# Altium footprint library u025Library.PcbLib: 144 footprints (part 2 of 9)
Each footprint in its own frame and in the unit in brackets; x right, y up, seen from the top. Pads: shape width x height; smd on the part's side, far side on the other; paste and mask are expansions set on the pad; w line width, h text height; cw(c..) or ccw(c..) is an arc to the next point about the centre after c.
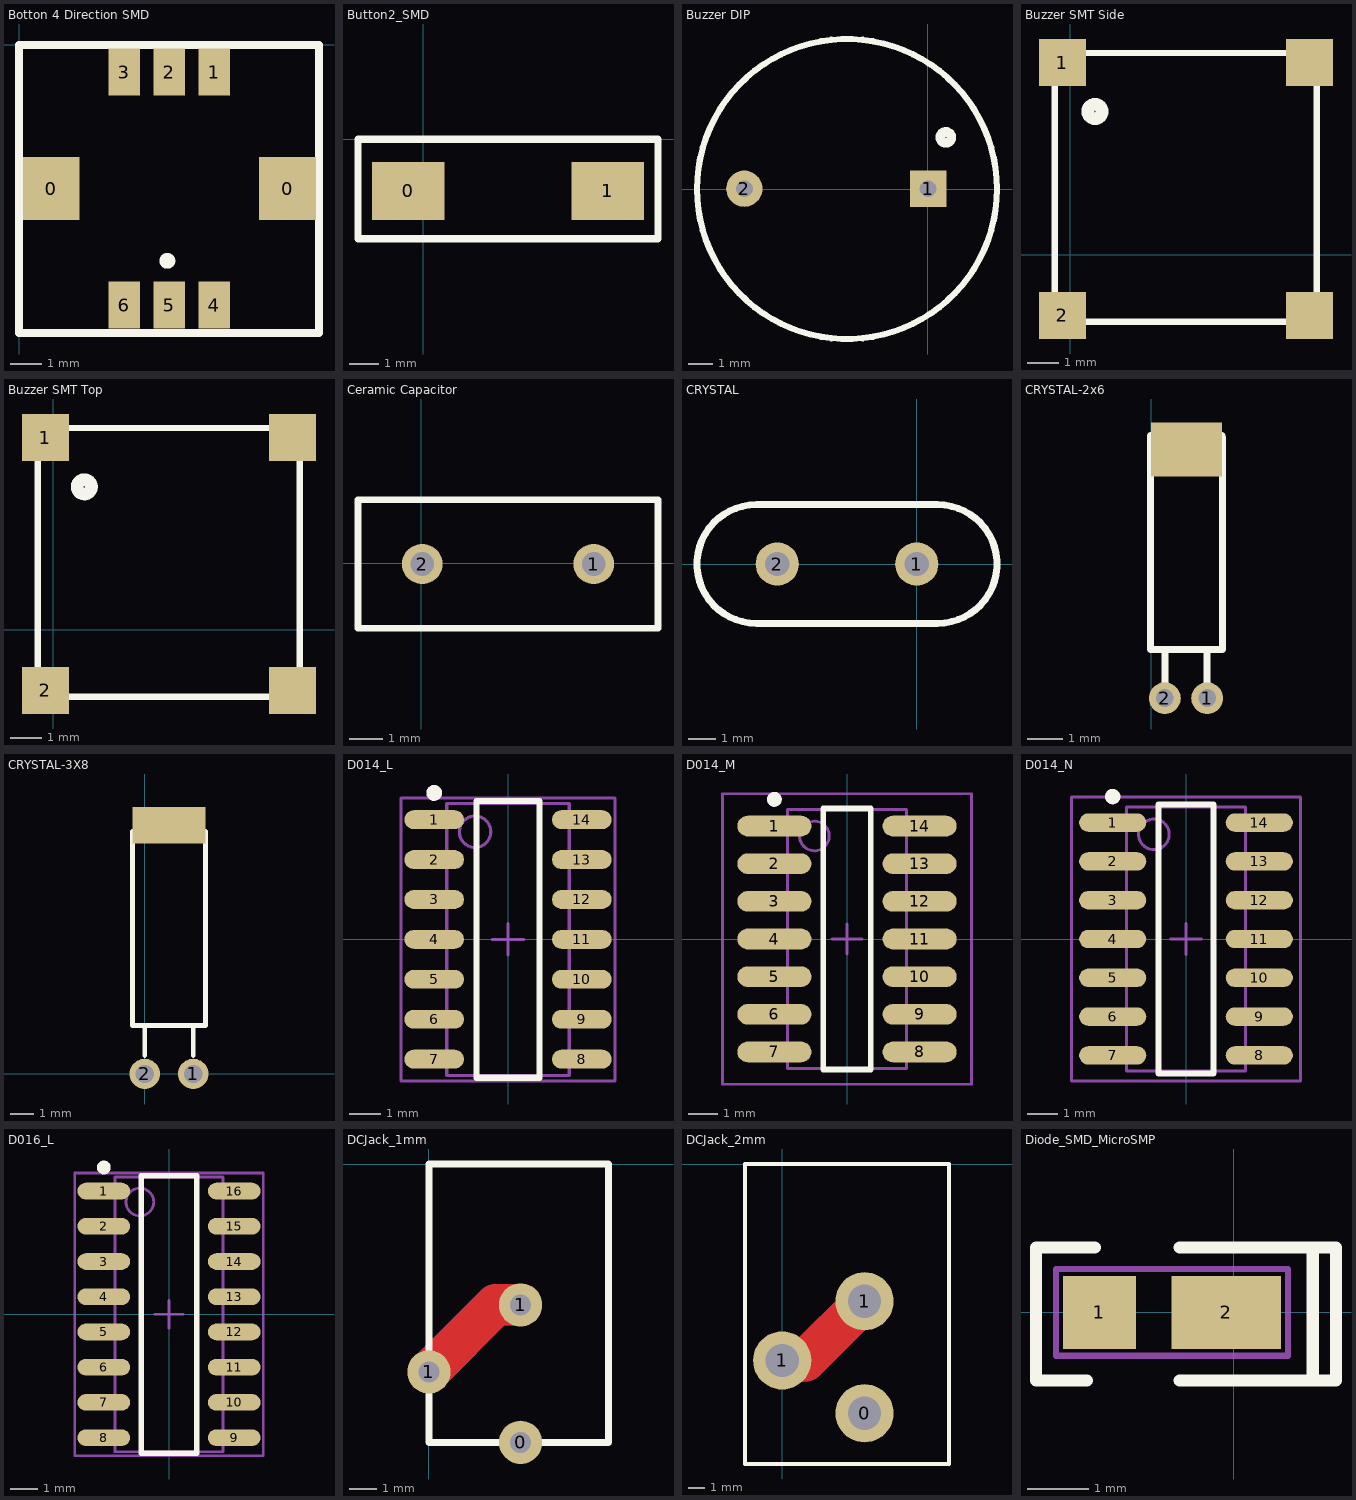
[diagram p1: the footprints below, top view; thin cyan lines are the x and y axes]

## Botton 4 Direction SMD [mm] "Botton 4 Direction SMD"
height 5
pads (8):
  rect 1.8x2 smd: 0(1.014,-4.567) 0(8.52,-4.567)
  rect 1x1.5 smd: 1(6.189,-0.867) 2(4.764,-0.867) 3(3.339,-0.867) 4(6.189,-8.267) 5(4.764,-8.267) 6(3.339,-8.267)
Top Overlay:
  circle w0.25: c4.705,-6.861 r0.125
  lines w0.254: -0.008,-9.15 -0.008,-0.008 9.517,-0.008 9.517,-9.15 -0.008,-9.15

## Button2_SMD [mm] "Button2_SMD"
height 4
pads (2):
  rect 2.5x2 smd: 0(-0.508,-1.778) 1(6.35,-1.778)
Top Overlay:
  lines w0.254: -2.235,-3.429 -2.235,0 8.077,0 8.077,-3.429 -2.235,-3.429
3D body: height 4.3, standoff 0, extent -2.052,-3.553 8.148,-0.053

## Buzzer DIP [mm] "Buzzer DIP"
height 6
pads (2):
  rect 1.5x1.5 hole 0.7: 1(0.009,0.011)
  round 1.5 hole 0.7: 2(-7.591,0.011)
Top Overlay:
  circle w0.254: c-3.347,0 r6.2
  circle w0.4: c0.738,2.134 r0.227
3D body: height 9.65, standoff -4.5, extent -9.658,-6.025 5.796,5.975

## Buzzer SMT Side [mm] "Buzzer SMT Side"
height 3
pads (4):
  rect 1.5x1.5 smd: 1(-0.254,6.096) 2(-0.254,-1.93) ""(7.595,6.096) ""(7.595,-1.93)
Top Overlay:
  circle w0.4: c0.779,4.545 r0.227
  lines w0.2: -0.5,1.8 -0.5,6.4 7.823,6.4 7.823,-2.134 -0.5,-2.134 -0.5,2.04
3D body: height 3, standoff 0, extent -0.508,-2.159 7.823,6.35

## Buzzer SMT Top [mm] "Buzzer SMT Top"
height 3
pads (4):
  rect 1.5x1.5 smd: 1(-0.254,6.096) 2(-0.254,-1.93) ""(7.595,6.096) ""(7.595,-1.93)
Top Overlay:
  circle w0.4: c0.981,4.533 r0.227
  lines w0.2: -0.5,1.8 -0.5,6.4 7.823,6.4 7.823,-2.134 -0.5,-2.134 -0.5,2.04
3D body: height 3, standoff 0, extent -0.508,-2.159 7.823,6.35

## Ceramic Capacitor [mm] "Ceramic Capacitor"
height 4
pads (2):
  round 1.2 hole 0.7: 1(5.11,-0.028) 2(0.03,-0.028)
Top Overlay:
  lines w0.2: -1.875,-1.933 -1.875,1.877 7.015,1.877 7.015,-1.933 -1.875,-1.933
3D body: height 7.5, standoff -1, extent -0.875,-0.823 6.116,0.874

## CRYSTAL [mil]
pads (2):
  round 62 hole 35: 1(0,0) 2(-200,0)
Top Overlay:
  lines w10: -230,-85 cw(c-230,0) -230,85 30,85 cw(c30,0) 30,-85 -230,-85
3D body: height 141.73, standoff -118.11, extent -316,-92.41 116.28,84.41

## CRYSTAL-2x6 [mm] "CRYSTAL - 2mm x 6mm"
pads (3):
  round 0.9 hole 0.5: 1(1.575,2.743) 2(0.381,2.743)
  rect 2x1.524 smd: ""(0.989,9.775)
Top Overlay:
  lines w0.203: -0.025,4.115 1.975,4.115 ; -0.025,4.166 -0.025,10.166 ; 0,10.16 2,10.16 ; 0.381,2.743 0.381,4.013 ; 1.575,2.743 1.575,4.013 ; 2.007,4.115 2.007,10.115

## CRYSTAL-3X8 [mil] "CRYSTAL-3X8"
pads (3):
  round 50 hole 30: 1(80,0) 2(0,0)
  rect 120x60 smd: ""(40,410)
Top Overlay:
  lines w8: 0,30 0,80 ; 80,30 80,80 ; -20,80 100,80 100,400 -20,400 -20,80
3D body: height 120.08, standoff -1.97, extent -24.52,-11.74 97.53,427.23

## D014_L [mm] "SOIC, 14-Leads, Body 8.7x3.9mm, Pitch 1.27mm, IPC High Density"
height 1.75
pads (14):
  oval 1.9x0.6 smd: 1(-2.35,3.81) 2(-2.35,2.54) 3(-2.35,1.27) 4(-2.35,0) 5(-2.35,-1.27) 6(-2.35,-2.54) 7(-2.35,-3.81) 8(2.35,-3.81) 9(2.35,-2.54) 10(2.35,-1.27) 11(2.35,0) 12(2.35,1.27) 13(2.35,2.54) 14(2.35,3.81)
Top Overlay:
  circle w0.25: c-2.35,4.66 r0.125
  lines w0.2: -1,-4.4 1,-4.4 1,4.4 -1,4.4 -1,-4.4
Mechanical 13:
  circle w0.1: c-1.05,3.425 r0.5
  lines w0.1: -1.95,-4.325 1.95,-4.325 1.95,4.325 -1.95,4.325 -1.95,-4.325
Mechanical 15:
  lines w0.1: -0.5,0 0.5,0 ; 0,-0.5 0,0.5 ; -3.4,-4.5 3.4,-4.5 3.4,4.5 -3.4,4.5 -3.4,-4.5
3D body: height 1.7, standoff 0, extent -2.984,-4.398 3.016,4.402

## D014_M [mm] "SOIC, 14-Leads, Body 8.7x3.9mm, Pitch 1.27mm, IPC Low Density"
height 1.75
pads (14):
  oval 2.5x0.7 smd: 1(-2.45,3.81) 2(-2.45,2.54) 3(-2.45,1.27) 4(-2.45,0) 5(-2.45,-1.27) 6(-2.45,-2.54) 7(-2.45,-3.81) 8(2.45,-3.81) 9(2.45,-2.54) 10(2.45,-1.27) 11(2.45,0) 12(2.45,1.27) 13(2.45,2.54) 14(2.45,3.81)
Top Overlay:
  circle w0.25: c-2.45,4.71 r0.125
  lines w0.2: -0.8,-4.4 0.8,-4.4 0.8,4.4 -0.8,4.4 -0.8,-4.4
Mechanical 13:
  circle w0.1: c-1.1,3.475 r0.5
  lines w0.1: -2,-4.375 2,-4.375 2,4.375 -2,4.375 -2,-4.375
Mechanical 15:
  lines w0.1: -0.5,0 0.5,0 ; 0,-0.5 0,0.5 ; -4.2,-4.9 4.2,-4.9 4.2,4.9 -4.2,4.9 -4.2,-4.9
3D body: height 1.7, standoff 0, extent -3.006,-4.401 2.994,4.399

## D014_N [mm] "SOIC, 14-Leads, Body 8.7x3.9mm, Pitch 1.27mm, IPC Medium Density"
height 1.75
pads (14):
  oval 2.2x0.6 smd: 1(-2.4,3.81) 2(-2.4,2.54) 3(-2.4,1.27) 4(-2.4,0) 5(-2.4,-1.27) 6(-2.4,-2.54) 7(-2.4,-3.81) 8(2.4,-3.81) 9(2.4,-2.54) 10(2.4,-1.27) 11(2.4,0) 12(2.4,1.27) 13(2.4,2.54) 14(2.4,3.81)
Top Overlay:
  circle w0.25: c-2.4,4.66 r0.125
  lines w0.2: -0.9,-4.4 0.9,-4.4 0.9,4.4 -0.9,4.4 -0.9,-4.4
Mechanical 13:
  circle w0.1: c-1.05,3.425 r0.5
  lines w0.1: -1.95,-4.325 1.95,-4.325 1.95,4.325 -1.95,4.325 -1.95,-4.325
Mechanical 15:
  lines w0.1: -0.5,0 0.5,0 ; 0,-0.5 0,0.5 ; -3.75,-4.65 3.75,-4.65 3.75,4.65 -3.75,4.65 -3.75,-4.65
3D body: height 1.7, standoff 0, extent -2.939,-4.399 3.061,4.401

## D016_L [mm] "SOIC, 16-Leads, Body 9.9x3.9mm, Pitch 1.27mm, IPC High Density"
height 1.75
pads (16):
  oval 1.9x0.6 smd: 1(-2.35,4.445) 2(-2.35,3.175) 3(-2.35,1.905) 4(-2.35,0.635) 5(-2.35,-0.635) 6(-2.35,-1.905) 7(-2.35,-3.175) 8(-2.35,-4.445) 9(2.35,-4.445) 10(2.35,-3.175) 11(2.35,-1.905) 12(2.35,-0.635) 13(2.35,0.635) 14(2.35,1.905) 15(2.35,3.175) 16(2.35,4.445)
Top Overlay:
  circle w0.25: c-2.35,5.295 r0.125
  lines w0.2: -1,-5 -1,5 1,5 1,-5 -1,-5
Mechanical 13:
  circle w0.1: c-1.05,4.05 r0.5
  lines w0.1: -1.95,-4.95 -1.95,4.95 1.95,4.95 1.95,-4.95 -1.95,-4.95
Mechanical 15:
  lines w0.1: -0.5,0 0.5,0 ; 0,-0.5 0,0.5 ; -3.4,-5.1 -3.4,5.1 3.4,5.1 3.4,-5.1 -3.4,-5.1
3D body: height 1.4, standoff 0, extent -2.969,-4.93 3.031,4.97

## DCJack_1mm [mil] "DCJack_1mm"
pads (3):
  round 61.42 hole 30: 0(130,-395) 1(0,-295) 1(130,-200)
Top Layer:
  lines w59.06: 0,-295 95,-200 130,-200
Bottom Layer:
  lines w59.06: 0,-295 95,-200 130,-200
Top Overlay:
  lines w10: 0,-395 255,-395 ; 0,-393.7 0,0 255,0 255,-393.7

## DCJack_2mm [mm] "DCJack_2mm"
pads (3):
  round 3.5 hole 2: 0(4.953,-14.986) 1(0,-11.811) 1(4.953,-8.255)
Top Layer:
  lines w2.5: 0,-11.811 1.397,-11.811 4.953,-8.255
Bottom Layer:
  lines w0.254: 3.556,-8.255 4.953,-8.255
  lines w2.5: 0,-11.811 1.397,-11.811 4.953,-8.255
Top Overlay:
  lines w0.254: 10,0 -2.235,0 -2.235,-18.034 10.033,-18.034 10.033,0
3D body: height 10.5, standoff -4, extent -0.11,-15.676 9.246,-0.376

## Diode_SMD_MicroSMP [mm] "Diode_SMD_MicroSMP"
height 0.6
pads (2):
  rect 1.2x1.2 smd: 1(-2.21,0)
  rect 1.8x1.2 smd: 2(-0.127,0)
Top Overlay:
  lines w0.2: -2.413,-1.118 -3.251,-1.118 -3.251,1.067 -2.286,1.067 ; -0.889,-1.118 1.676,-1.118 1.676,1.067 -0.889,1.067 ; 1.295,-1.067 1.295,1.041
Mechanical 15:
  lines w0.1: -2.921,-0.711 -2.921,0.711 0.889,0.711 0.889,-0.711 -2.921,-0.711
3D body: height 0.73, standoff 0, extent -2.036,-0.776 0.664,0.624